# Altium footprint library Project_Oshinoko.PcbLib: 211 footprints (part 11 of 14)
Each footprint in its own frame and in the unit in brackets; x right, y up, seen from the top. Pads: shape width x height; smd on the part's side, far side on the other; paste and mask are expansions set on the pad; w line width, h text height; cw(c..) or ccw(c..) is an arc to the next point about the centre after c.
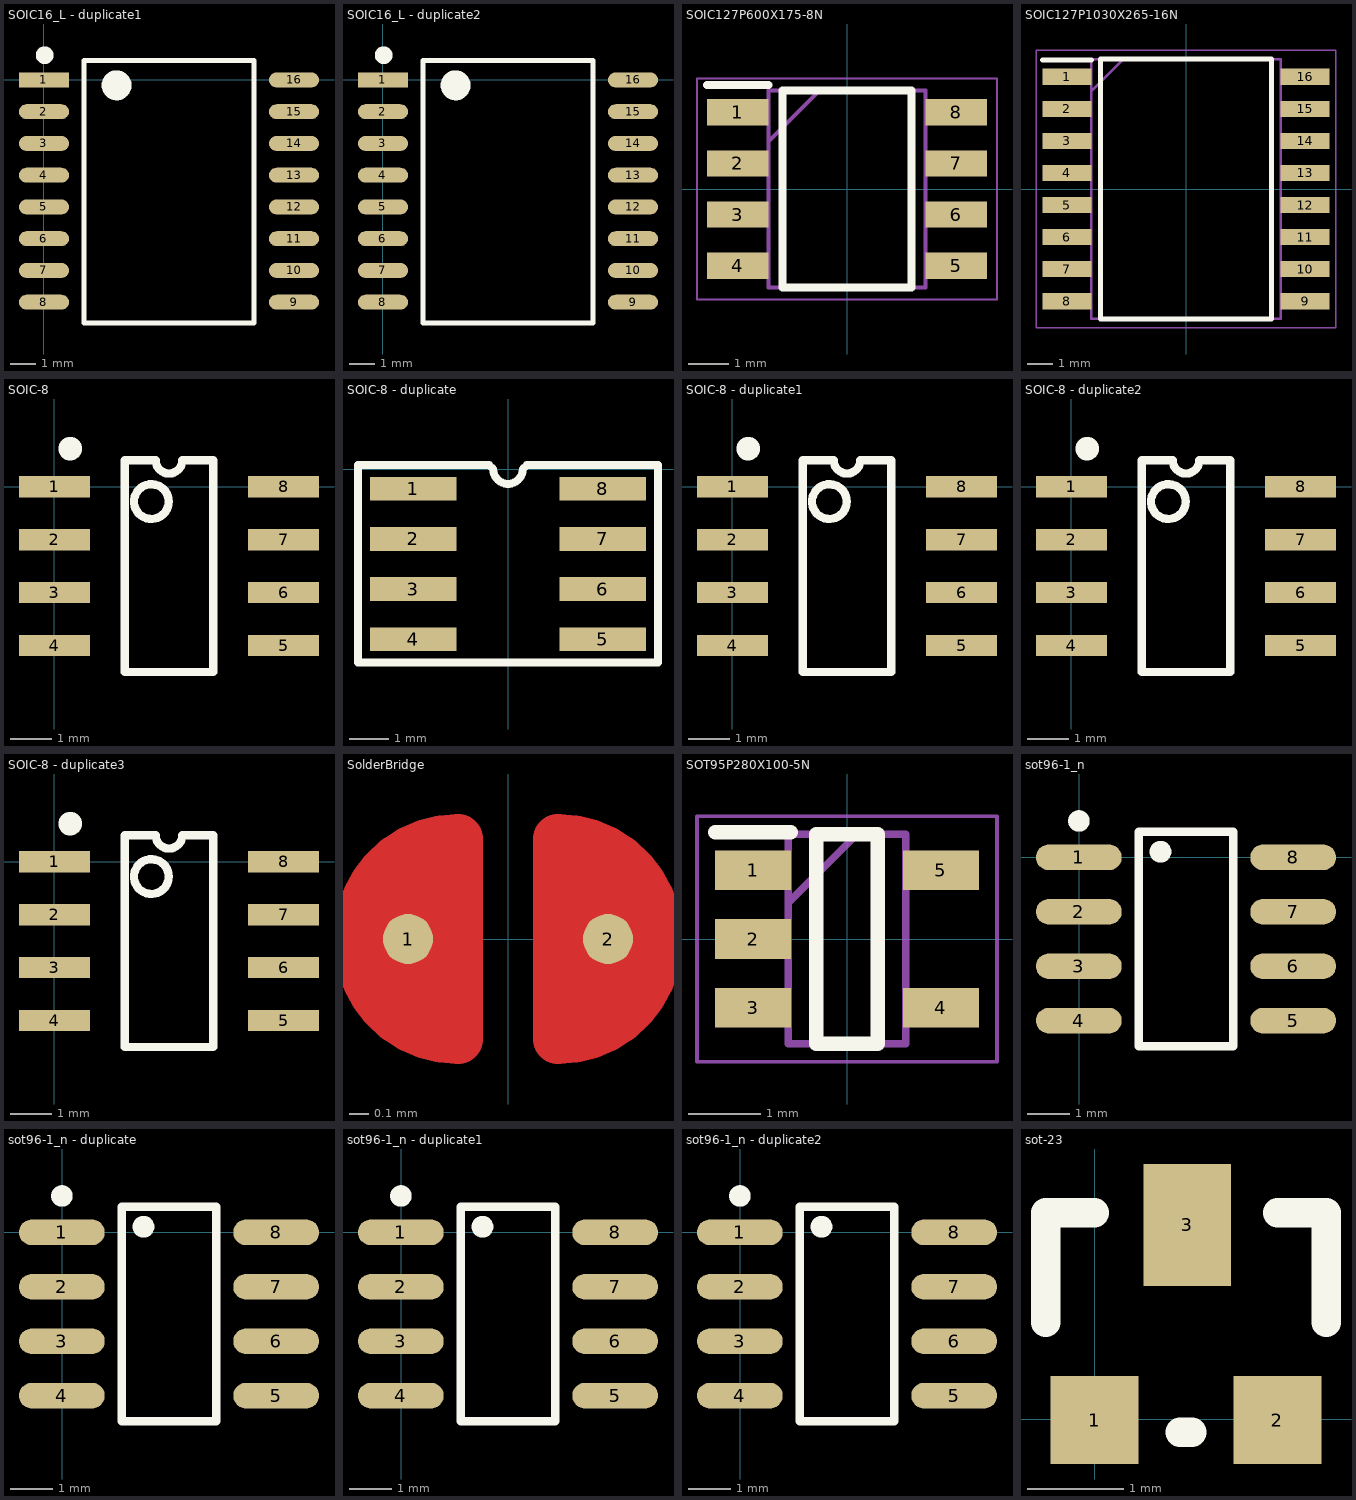
[diagram p10: the footprints below, top view; thin cyan lines are the x and y axes]

## SOIC16_L - duplicate1 [mm]
pads (16):
  rect 2x0.6 smd: 1(0,0)
  oval 2x0.6 smd: 2(0,-1.27) 3(0,-2.54) 4(0,-3.81) 5(0,-5.08) 6(0,-6.35) 7(0,-7.62) 8(0,-8.89) 9(10,-8.89) 10(10,-7.62) 11(10,-6.35) 12(10,-5.08) 13(10,-3.81) 14(10,-2.54) 15(10,-1.27) 16(10,0)
Top Overlay:
  circle w0.6: c2.905,-0.213 r0.3
  circle w0.356: c0.025,0.991 r0.178
  lines w0.2: 1.6,-9.713 8.4,-9.713 8.4,0.787 1.6,0.787 1.6,-9.713

## SOIC16_L - duplicate2 [mm]
pads (16):
  rect 2x0.6 smd: 1(0,0)
  oval 2x0.6 smd: 2(0,-1.27) 3(0,-2.54) 4(0,-3.81) 5(0,-5.08) 6(0,-6.35) 7(0,-7.62) 8(0,-8.89) 9(10,-8.89) 10(10,-7.62) 11(10,-6.35) 12(10,-5.08) 13(10,-3.81) 14(10,-2.54) 15(10,-1.27) 16(10,0)
Top Overlay:
  circle w0.6: c2.905,-0.213 r0.3
  circle w0.356: c0.025,0.991 r0.178
  lines w0.2: 1.6,-9.713 8.4,-9.713 8.4,0.787 1.6,0.787 1.6,-9.713

## SOIC127P600X175-8N [mm]
pads (8):
  rect 1.525x0.65 smd: 1(-2.712,1.905) 2(-2.712,0.635) 3(-2.712,-0.635) 4(-2.712,-1.905) 5(2.712,-1.905) 6(2.712,-0.635) 7(2.712,0.635) 8(2.712,1.905)
Top Overlay:
  lines w0.2: -3.475,2.58 -1.95,2.58 ; -1.6,-2.45 1.6,-2.45 1.6,2.45 -1.6,2.45 -1.6,-2.45
Mechanical 13:
  lines w0.1: -1.95,1.18 -0.68,2.45 ; -1.95,-2.45 1.95,-2.45 1.95,2.45 -1.95,2.45 -1.95,-2.45
Mechanical 15:
  lines w0.05: -3.725,-2.75 3.725,-2.75 3.725,2.75 -3.725,2.75 -3.725,-2.75
3D body "NE555DR.stp": height 1.75, standoff 0, extent -3,-2.45 3,2.45

## SOIC127P1030X265-16N [mm]
pads (16):
  rect 1.95x0.65 smd: 1(-4.725,4.445) 2(-4.725,3.175) 3(-4.725,1.905) 4(-4.725,0.635) 5(-4.725,-0.635) 6(-4.725,-1.905) 7(-4.725,-3.175) 8(-4.725,-4.445) 9(4.725,-4.445) 10(4.725,-3.175) 11(4.725,-1.905) 12(4.725,-0.635) 13(4.725,0.635) 14(4.725,1.905) 15(4.725,3.175) 16(4.725,4.445)
Top Overlay:
  lines w0.2: -5.7,5.12 -3.75,5.12 ; -3.4,-5.15 3.4,-5.15 3.4,5.15 -3.4,5.15 -3.4,-5.15
Mechanical 13:
  lines w0.1: -3.75,3.88 -2.48,5.15 ; -3.75,-5.15 3.75,-5.15 3.75,5.15 -3.75,5.15 -3.75,-5.15
Mechanical 15:
  lines w0.05: -5.95,-5.5 5.95,-5.5 5.95,5.5 -5.95,5.5 -5.95,-5.5
3D body "ACS724LMATR-20AB-T.stp": height 2.57, standoff 0, extent -5.163,-5.199 5.162,5.19

## SOIC-8 [mm]
pads (8):
  rect 1.7x0.51 smd: 1(0,0) 2(0,-1.27) 3(0,-2.54) 4(0,-3.81) 5(5.5,-3.81) 6(5.5,-2.54) 7(5.5,-1.27) 8(5.5,0)
Top Overlay:
  circle w0.508: c0.378,0.914 r0.028
  circle w0.2: c2.327,-0.356 r0.417
  lines w0.2: 1.685,-4.445 1.685,-3.175 1.685,-0.635 1.685,0.635 2.432,0.635 ccw(c2.75,0.635) 3.067,0.635 3.815,0.635 3.815,-4.445 1.685,-4.445

## SOIC-8 - duplicate [mm]
pads (8):
  rect 2.2x0.6 smd: 1(-2.4,-0.5) 2(-2.4,-1.77) 3(-2.4,-3.04) 4(-2.4,-4.31) 5(2.4,-4.31) 6(2.4,-3.04) 7(2.4,-1.77) 8(2.4,-0.5)
Top Overlay:
  lines w0.2: -3.8,-4.9 3.8,-4.9 3.8,0.1 0.475,0.1 0.375,0 cw(c0,0) -0.375,0 -0.475,0.1 -3.8,0.1 -3.8,-4.9
3D body "User Library-SOIC-8-1.STEP": height 1.75, standoff 0, extent -3,-4.85 3,0.05

## SOIC-8 - duplicate1 [mm]
pads (8):
  rect 1.7x0.51 smd: 1(0,0) 2(0,-1.27) 3(0,-2.54) 4(0,-3.81) 5(5.5,-3.81) 6(5.5,-2.54) 7(5.5,-1.27) 8(5.5,0)
Top Overlay:
  circle w0.2: c2.327,-0.356 r0.417
  circle w0.508: c0.378,0.914 r0.028
  lines w0.2: 1.685,-4.445 3.815,-4.445 3.815,0.635 3.067,0.635 cw(c2.75,0.635) 2.432,0.635 1.685,0.635 1.685,-0.635 1.685,-3.175 1.685,-4.445

## SOIC-8 - duplicate2 [mm]
pads (8):
  rect 1.7x0.51 smd: 1(0,0) 2(0,-1.27) 3(0,-2.54) 4(0,-3.81) 5(5.5,-3.81) 6(5.5,-2.54) 7(5.5,-1.27) 8(5.5,0)
Top Overlay:
  circle w0.2: c2.327,-0.356 r0.417
  circle w0.508: c0.378,0.914 r0.028
  lines w0.2: 1.685,-4.445 3.815,-4.445 3.815,0.635 3.067,0.635 cw(c2.75,0.635) 2.432,0.635 1.685,0.635 1.685,-0.635 1.685,-3.175 1.685,-4.445

## SOIC-8 - duplicate3 [mm]
pads (8):
  rect 1.7x0.51 smd: 1(0,0) 2(0,-1.27) 3(0,-2.54) 4(0,-3.81) 5(5.5,-3.81) 6(5.5,-2.54) 7(5.5,-1.27) 8(5.5,0)
Top Overlay:
  circle w0.2: c2.327,-0.356 r0.417
  circle w0.508: c0.378,0.914 r0.028
  lines w0.2: 1.685,-4.445 3.815,-4.445 3.815,0.635 3.068,0.635 cw(c2.75,0.635) 2.432,0.635 1.685,0.635 1.685,-0.635 1.685,-3.175 1.685,-4.445

## SolderBridge [mil]
pads (2):
  round 10 smd mask+0: 1(-20,0) 2(20,0)
Top Layer:
  region: 10,20 20,20 30,10 30,-10 20,-20 10,-20
  region: -10,-20 -20,-20 -30,-10 -30,10 -20,20 -10,20
  lines w10: -10,0 -10,-20 ; -10,-20 cw(c-10,0) -10,20 -10,-20 ; 10,-20 ccw(c10,0) 10,20 10,-20
Top Solder:
  circle w29: c-10,0 r11
  circle w29: c10,0 r11
  lines w11: -10,-20 10,-20 ; -10,20 10,20

## SOT95P280X100-5N [mm]
pads (5):
  rect 1.05x0.55 smd: 1(-1.3,0.95) 2(-1.3,0) 3(-1.3,-0.95) 4(1.3,-0.95) 5(1.3,0.95)
Top Overlay:
  lines w0.2: -1.825,1.475 -0.775,1.475 ; -0.425,-1.45 -0.425,1.45 0.425,1.45 0.425,-1.45 -0.425,-1.45
Mechanical 13:
  lines w0.1: -0.812,0.5 0.138,1.45 ; -0.812,-1.45 -0.812,1.45 0.812,1.45 0.812,-1.45 -0.812,-1.45
Mechanical 15:
  lines w0.05: -2.075,-1.7 -2.075,1.7 2.075,1.7 2.075,-1.7 -2.075,-1.7
3D body "LTC6240HVCS5#TRMPBF.stp": height 1, standoff 0, extent -1.4,-1.45 1.4,1.45

## sot96-1_n [mm]
pads (8):
  oval 2x0.6 smd: 1(-0.004,-0.008) 2(-0.004,-1.278) 3(-0.004,-2.548) 4(-0.004,-3.818) 5(4.996,-3.818) 6(4.996,-2.548) 7(4.996,-1.278) 8(4.996,-0.008)
Top Overlay:
  circle w0.254: c1.901,0.123 r0.127
  circle w0.25: c-0.004,0.842 r0.125
  lines w0.2: 1.396,-4.413 3.596,-4.413 3.596,0.588 1.396,0.588 1.396,-4.413

## sot96-1_n - duplicate [mm]
pads (8):
  oval 2x0.6 smd: 1(-0.004,-0.008) 2(-0.004,-1.278) 3(-0.004,-2.548) 4(-0.004,-3.818) 5(4.996,-3.818) 6(4.996,-2.548) 7(4.996,-1.278) 8(4.996,-0.008)
Top Overlay:
  circle w0.254: c1.901,0.123 r0.127
  circle w0.25: c-0.004,0.842 r0.125
  lines w0.2: 1.396,-4.413 3.596,-4.413 3.596,0.588 1.396,0.588 1.396,-4.413

## sot96-1_n - duplicate1 [mm]
pads (8):
  oval 2x0.6 smd: 1(-0.004,-0.008) 2(-0.004,-1.278) 3(-0.004,-2.548) 4(-0.004,-3.818) 5(4.996,-3.818) 6(4.996,-2.548) 7(4.996,-1.278) 8(4.996,-0.008)
Top Overlay:
  circle w0.254: c1.901,0.123 r0.127
  circle w0.25: c-0.004,0.842 r0.125
  lines w0.2: 1.396,-4.413 3.596,-4.413 3.596,0.588 1.396,0.588 1.396,-4.413

## sot96-1_n - duplicate2 [mm]
pads (8):
  oval 2x0.6 smd: 1(-0.004,-0.008) 2(-0.004,-1.278) 3(-0.004,-2.548) 4(-0.004,-3.818) 5(4.996,-3.818) 6(4.996,-2.548) 7(4.996,-1.278) 8(4.996,-0.008)
Top Overlay:
  circle w0.254: c1.901,0.123 r0.127
  circle w0.25: c-0.004,0.842 r0.125
  lines w0.2: 1.396,-4.413 3.596,-4.413 3.596,0.588 1.396,0.588 1.396,-4.413

## sot-23 [mil]
height 23.62
pads (3):
  rect 36x36 smd: 1(-0.02,-0.41) 2(74.98,-0.41)
  rect 36x50 smd: 3(37.98,79.59)
Top Overlay:
  lines w12: -20.02,39.59 -20.02,84.59 -0.02,84.59 ; 34.98,-5.41 39.98,-5.41 ; 74.98,84.59 94.98,84.59 94.98,39.59